# Altium footprint library AHMET_CAN_KARACAN.PcbL.PcbLib: 65 footprints (part 3 of 5)
Each footprint in its own frame and in the unit in brackets; x right, y up, seen from the top. Pads: shape width x height; smd on the part's side, far side on the other; paste and mask are expansions set on the pad; w line width, h text height; cw(c..) or ccw(c..) is an arc to the next point about the centre after c.
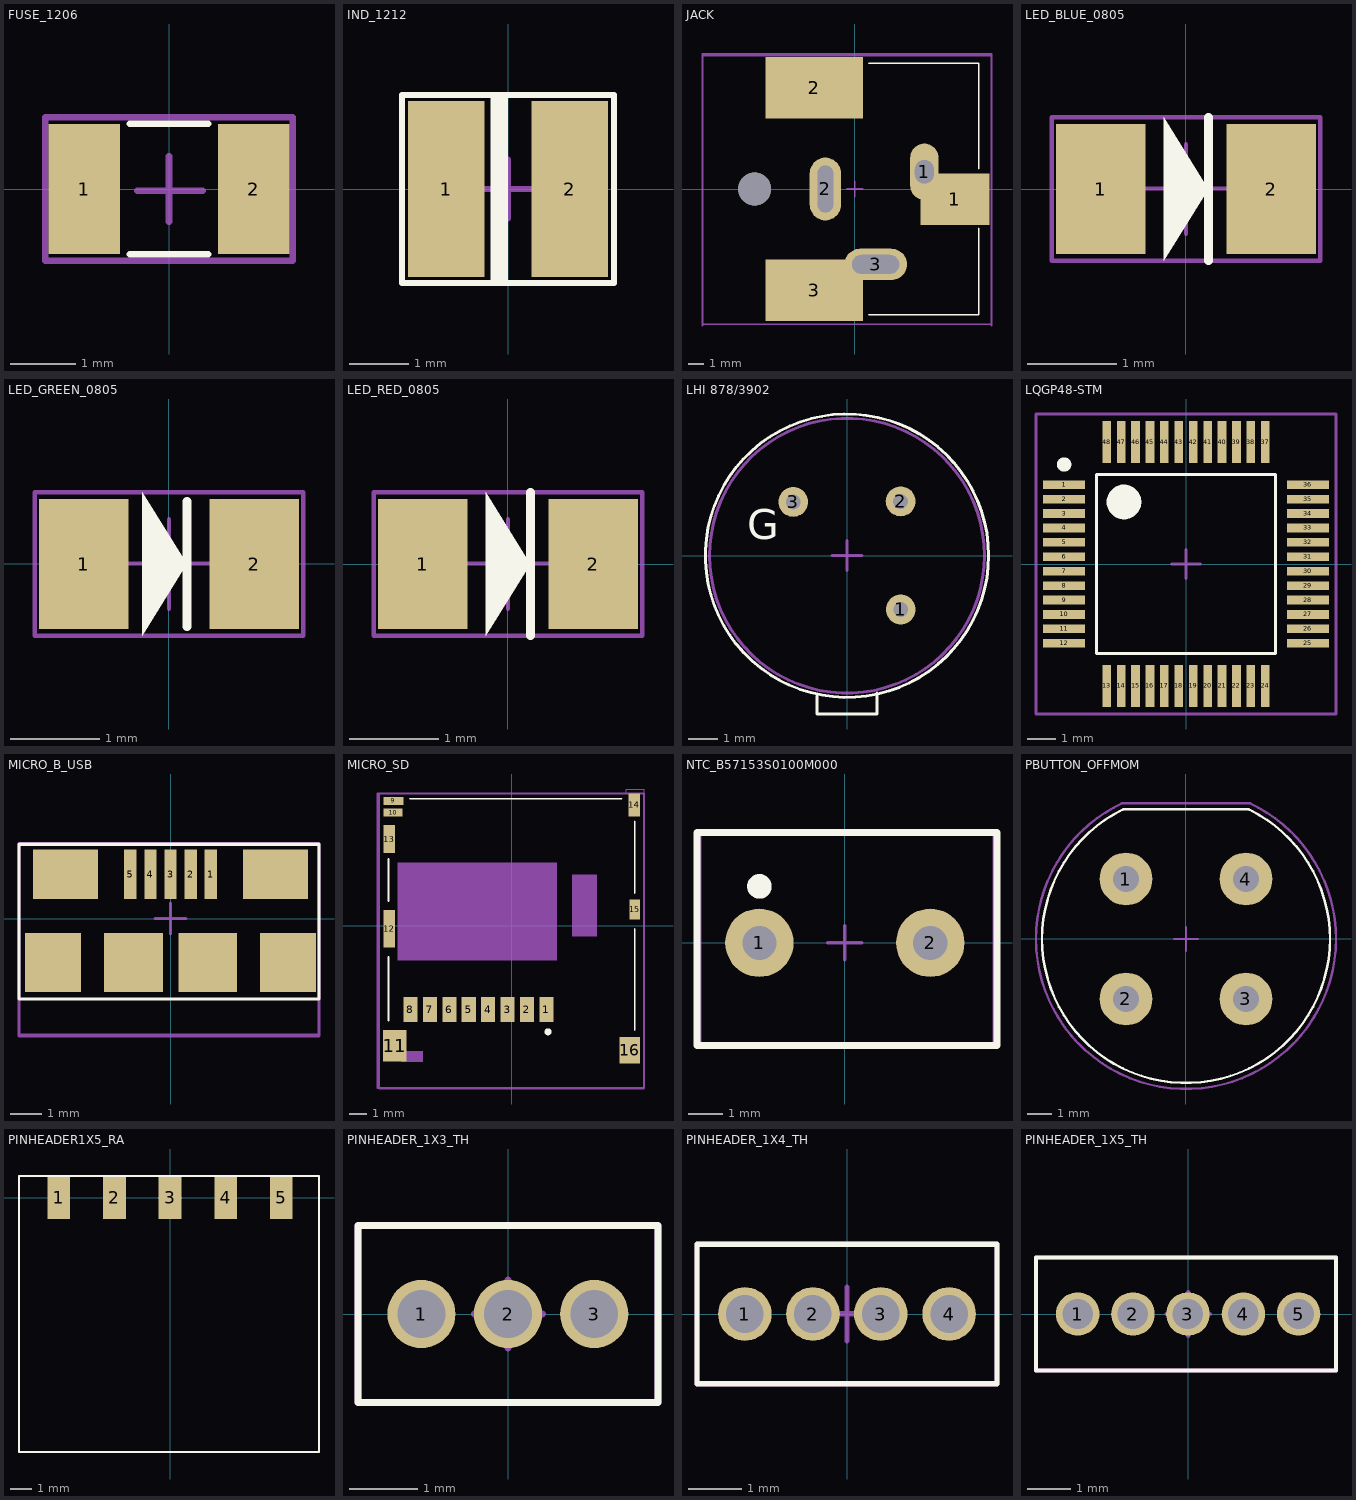
[diagram p2: the footprints below, top view; thin cyan lines are the x and y axes]

## FUSE_1206 [mm]
pads (2):
  rect 1.1x2 smd mask+0.05: 1(-1.3,0) 2(1.3,0)
Top Overlay:
  lines w0.1: -0.6,-1 0.6,-1 ; -0.6,1 0.6,1
Top Component Center:
  lines w0.1: -0.486,-0.024 0.514,-0.024 ; 0,-0.5 0,0.5 ; -1.9,-1.1 1.9,-1.1 1.9,1.1 -1.9,1.1 -1.9,-1.1
Top Designator:
  lines w0.1: -1.9,-1.1 1.9,-1.1 1.9,1.1 -1.9,1.1 -1.9,-1.1
  text ".Designator" at -0.95,-0.317 h1
3D body "FUSE_1206.step": height 0.61, standoff 0, extent -1.55,-0.775 1.55,0.775

## IND_1212 [mm]
pads (2):
  rect 1.3x3 smd mask+0.05: 1(-1.05,0) 2(1.05,0)
Top Overlay:
  rectangle: -0.3,-1.6 0,1.6
  lines w0.1: -1.8,-1.6 1.8,-1.6 1.8,1.6 -1.8,1.6 -1.8,-1.6
Top Component Center:
  lines w0.1: -0.5,0 0.5,0 ; 0,-0.5 0,0.5 ; -1.8,-1.6 1.8,-1.6 1.8,1.6 -1.8,1.6 -1.8,-1.6
Top Designator:
  lines w0.1: -1.8,-1.6 1.8,-1.6 1.8,1.6 -1.8,1.6 -1.8,-1.6
  text ".Designator" at -0.8,-0.35 h0.75
3D body "IND_1212.STEP": height 1.5, standoff 0, extent -1.5,-1.5 1.5,1.5

## JACK [mm]
pads (7):
  oval 1.8x3.6 hole 1.2 slot 1.5 at 90 deg: 1(4.425,1.1)
  rect 4.4x3.3 smd: 1(6.375,-0.65)
  rect 6.2x3.9 smd: 2(-2.575,6.45) 3(-2.575,-6.45)
  oval 2x4 hole 1 slot 3 at 90 deg: 2(-1.875,0)
  oval 4x2 hole 1.2 slot 3 at 0 deg: 3(1.325,-4.8)
  round 2.1 hole 2.1 unplated: ""(-6.375,0)
Top Overlay:
  lines w0.1: 0.9,-8 7.9,-8 7.9,-2.5 ; 7.9,8 0.9,8 7.9,8 ; 7.9,8 7.9,1.3 7.9,8
Top Component Center:
  lines w0.1: -9.7,-8.7 -9.7,8.5 8.7,8.5 8.7,-8.7 ; -9.7,-8.6 8.7,-8.6 ; -0.5,0 0.5,0 ; 0,-0.5 0,0.5
Top Designator:
  lines w0.1: -9.7,-8.7 -9.7,8.6 8.7,8.6 8.7,-8.7 ; -9.7,-8.6 8.7,-8.6
  text ".Designator" at -2.246,-0.738 h1.52
3D body "JACK_PJ-037AH-SMT-TR.stp": height 11.1, standoff -3.3, extent -9.575,-7.625 7.525,7.575

## LED_BLUE_0805 [mm]
pads (2):
  rect 1x1.45 smd mask+0.05: 1(-0.95,0) 2(0.95,0)
Top Overlay:
  region: -0.25,0.8 -0.25,-0.8 0.25,0
  lines w0.1: 0.25,-0.8 0.25,0.8
Top Component Center:
  lines w0.05: -0.487,0.006 0.513,0.006 ; 0,-0.5 0,0.5 ; -1.5,-0.8 1.5,-0.8 1.5,0.8 -1.5,0.8 -1.5,-0.8
Top Designator:
  lines w0.05: -1.5,-0.8 1.5,-0.8 1.5,0.8 -1.5,0.8 -1.5,-0.8
3D body "0805 Blue.step": height 0.78, standoff 0, extent -1,-0.625 1,0.625

## LED_GREEN_0805 [mm]
pads (2):
  rect 1x1.45 smd mask+0.05: 1(-0.95,0) 2(0.95,0)
Top Overlay:
  region: -0.3,0.8 -0.3,-0.8 0.2,0
  lines w0.1: 0.2,0 0.2,-0.7 0.2,0.7
Top Component Center:
  lines w0.05: -0.487,0.006 0.513,0.006 ; 0,-0.5 0,0.5 ; -1.5,-0.8 1.5,-0.8 1.5,0.8 -1.5,0.8 -1.5,-0.8
Top Designator:
  lines w0.05: -1.5,-0.8 1.5,-0.8 1.5,0.8 -1.5,0.8 -1.5,-0.8
3D body "LED-0805-Green.step": height 0.8, standoff -0.01, extent -1.01,-0.625 1.01,0.625

## LED_RED_0805 [mm]
pads (2):
  rect 1x1.45 smd mask+0.05: 1(-0.95,0) 2(0.95,0)
Top Overlay:
  region: -0.25,0.8 -0.25,-0.8 0.25,0
  lines w0.1: 0.25,-0.8 0.25,0.8
Top Component Center:
  lines w0.05: -0.487,0.006 0.513,0.006 ; 0,-0.5 0,0.5 ; -1.5,-0.8 -1.5,0.8 1.5,0.8 1.5,-0.8 -1.5,-0.8
Top Designator:
  lines w0.05: -1.5,-0.8 -1.5,0.8 1.5,0.8 1.5,-0.8 -1.5,-0.8
3D body "LED-0805-Red.step": height 0.8, standoff -0.01, extent -1.01,-0.625 1.01,0.625

## LHI 878/3902 [mm]
pads (3):
  round 1 hole 0.5 mask+0.05: 1(1.8,-1.8) 2(1.796,1.818) 3(-1.8,1.8)
Top Overlay:
  circle w0.1: c0,0 r4.742
  lines w0.1: -1,-4.7 -1,-5.3 1,-5.3 1,-4.6
  text "G" at -3.346,0.554 h1
Top Component Center:
  circle w0.1: c0,0 r4.6
  lines w0.1: -0.5,0 0.5,0 0,0 0,-0.5 0,0.5
Top Designator:
  circle w0.1: c0,0 r4.6
  text ".Designator" at -0.946,-0.438 h1.52
3D body "LHI878.step": height 4.6, standoff -2.4, extent -4.6,-5.029 4.6,4.6

## LQGP48-STM [mm] "TSQFP, 48-Leads, Body 7,00x7,00mm, Pitch 0,50mm, IPC Medium Density"
height 1.6
pads (48):
  rect 1.45x0.3 smd mask+0.055: 1(-4.225,2.75) 2(-4.225,2.25) 3(-4.225,1.75) 4(-4.225,1.25) 5(-4.225,0.75) 6(-4.225,0.25) 7(-4.225,-0.25) 8(-4.225,-0.75) 9(-4.225,-1.25) 10(-4.225,-1.75) 11(-4.225,-2.25) 12(-4.225,-2.75) 25(4.225,-2.75) 26(4.225,-2.25) 27(4.225,-1.75) 28(4.225,-1.25) 29(4.225,-0.75) 30(4.225,-0.25) 31(4.225,0.25) 32(4.225,0.75) 33(4.225,1.25) 34(4.225,1.75) 35(4.225,2.25) 36(4.225,2.75)
  rect 0.3x1.45 smd mask+0.055: 13(-2.75,-4.225) 14(-2.25,-4.225) 15(-1.75,-4.225) 16(-1.25,-4.225) 17(-0.75,-4.225) 18(-0.25,-4.225) 19(0.25,-4.225) 20(0.75,-4.225) 21(1.25,-4.225) 22(1.75,-4.225) 23(2.25,-4.225) 24(2.75,-4.225) 37(2.75,4.225) 38(2.25,4.225) 39(1.75,4.225) 40(1.25,4.225) 41(0.75,4.225) 42(0.25,4.225) 43(-0.25,4.225) 44(-0.75,4.225) 45(-1.25,4.225) 46(-1.75,4.225) 47(-2.25,4.225) 48(-2.75,4.225)
Top Overlay:
  circle w0.6: c-2.15,2.15 r0.3
  circle w0.25: c-4.225,3.45 r0.125
  lines w0.1: -3.1,-3.1 3.1,-3.1 3.1,3.1 -3.1,3.1 -3.1,-3.1
Top Component Center:
  lines w0.1: -0.5,0 0.5,0 ; 0,-0.5 0,0.5 ; -5.2,-5.2 5.2,-5.2 5.2,5.2 -5.2,5.2 -5.2,-5.2
Top Designator:
  lines w0.1: -5.2,-5.2 -5.2,5.2 5.2,5.2 5.2,-5.2 -5.2,-5.2
  text ".Designator" at -2,-0.754 h2.54
3D body "LQGP48-STM-wo_thermal.step": height 1.6, standoff 0, extent -4.5,-4.5 4.5,4.5

## MICRO_B_USB [mm]
pads (11):
  rect 0.4x1.6 smd mask+0.05: 1(1.3,1.425) 2(0.65,1.425) 3(0,1.425) 4(-0.65,1.425) 5(-1.3,1.425)
  rect 1.8x1.9 smd mask+0.05: ""(-3.8,-1.425) ""(3.8,-1.425)
  rect 2.1x1.6 smd mask+0.05: ""(-3.4,1.425) ""(3.4,1.425)
  rect 1.9x1.9 smd mask+0.05: ""(-1.2,-1.425) ""(1.2,-1.425)
Top Overlay:
  lines w0.1: -4.9,-2.6 -4.9,2.4 4.8,2.4 4.8,-2.6 -4.9,-2.6
Top Component Center:
  lines w0.1: -4.7,-3.775 -4.9,-3.775 ; -0.5,0 0.5,0 ; 0,-0.5 0,0.5 ; -4.9,-3.775 -4.9,2.425 4.8,2.425 4.8,-3.775 -4.9,-3.775
Top Designator:
  lines w0.1: -4.9,-3.8 -4.9,2.4 4.8,2.4 4.8,-3.8 -4.9,-3.8
  text ".Designator" at -1.346,-0.738 h1.52
3D body "MICRO_B_USB.STEP": height 2.51, standoff -0.28, extent -3.955,-3.575 3.955,2.091

## MICRO_SD [mm]
pads (16):
  rect 0.8x1.4 smd: 1(1.965,-4.75) 2(0.865,-4.75) 3(-0.235,-4.75) 4(-1.335,-4.75) 5(-2.435,-4.75) 6(-3.535,-4.75) 7(-4.635,-4.75) 8(-5.735,-4.75)
  rect 1.15x0.45 smd: 9(-6.7,7.075)
  rect 1.1x0.45 smd: 10(-6.725,6.415)
  rect 1.35x1.8 smd: 11(-6.625,-6.8)
  rect 0.65x2.14 smd: 12(-6.95,-0.17)
  rect 0.65x1.6 smd: 13(-6.95,4.91)
  rect 0.65x1.3 smd: 14(6.95,6.85)
  rect 0.6x1.15 smd: 15(6.975,0.925)
  rect 1.16x1.5 smd: 16(6.695,-7.05)
Top Overlay:
  circle w0.2: c2.06,-6.01 r0.1
  lines w0.1: -6.975,-5.38 -6.975,-1.77 ; -6.975,1.41 -6.975,3.8 ; -5.77,7.2 6.24,7.2 ; 6.975,-5.9 6.975,-0.17 ; 6.975,1.85 6.975,5.91
Top Component Center:
  lines w0.1: -0.5,0 0.5,0 ; 0,-0.5 0,0.5 ; -7.5,-9.2 7.5,-9.2 7.5,7.5 -7.5,7.5 -7.5,-9.2
Top Designator:
  lines w0.1: -7.6,-9.2 7.5,-9.2 7.5,7.5 -7.6,7.5 -7.6,-9.2
  text ".Designator" at -2.65,-1.004 h2.54
Mechanical 15:
  region: 4.825,-0.6 3.426,-0.6 3.426,2.9 4.825,2.9
  region: 2.565,-1.964 -6.447,-1.964 -6.447,3.57 2.565,3.57
  region: -5.045,-7.713 -6.236,-7.713 -6.236,-7.1 -5.045,-7.1
  lines w0.05: -7.5,-9.25 7.5,-9.25 7.5,7.75 6.5,7.75 6.5,7.5 -7.5,7.5 -7.5,-9.25
3D body "MICRO_SD.stp": height 1.8, standoff 0, extent -7.03,-8.9 7,7.3

## NTC_B57153S0100M000 [mm]
pads (2):
  round 2 hole 1: 1(-2.5,0) 2(2.5,0)
Top Overlay:
  circle w0.4: c-2.5,1.65 r0.16
  lines w0.2: -4.325,-3 4.45,-3 4.45,3.225 -4.325,3.225 -4.325,-3
Top Component Center:
  lines w0.1: -0.5,0 0.5,0 ; 0,-0.5 0,0.5 ; -4.25,-3 -4.25,3.225 4.375,3.225 4.375,-3 -4.25,-3
Top Designator:
  lines w0.1: -4.275,-2.975 -4.275,3.2 4.425,3.2 4.425,-2.975 -4.275,-2.975
  text ".Designator" at -0.675,-0.358 h0.8
3D body "NTC F5 D8.5 B6 H13.step": height 13, standoff -3.6, extent -4.18,-3.075 4.311,3.125

## PBUTTON_OFFMOM [mm]
pads (4):
  round 2.2 hole 1.1: 1(-2.5,2.5) 2(-2.5,-2.5) 3(2.5,-2.5) 4(2.5,2.5)
Top Overlay:
  lines w0.1: -2.63,5.393 ccw(c0.001,-0.001) -6,-0.001 ccw(c0,0) 6,0 ; -2.615,5.4 2.615,5.4 ; 2.628,5.393 cw(c-0.003,-0.002) 6,-0.002
Top Component Center:
  lines w0.1: -2.672,5.65 2.672,5.65 ; -2.641,5.664 ccw(c0,0) -6.25,0 ccw(c0,0) 6.25,0 ; 0,-0.5 0,0.5 0,-0.5 ; 2.642,5.664 cw(c0.002,0.001) 6.25,0.001 ; -0.5,0 0.5,0 -0.5,0
Top Designator:
  lines w0.1: -2.672,5.65 2.672,5.65 ; -2.641,5.665 ccw(c0,0) -6.25,0 ccw(c0,0) 6.25,0 ; 2.642,5.664 cw(c0.002,0.001) 6.25,0.001
  text ".Designator" at -1.25,-0.417 h1
3D body "PBUTTON_OFFMOM.STEP": height 14.3, standoff -3.5, extent -6,-6 6,5.4

## PINHEADER1X5_RA [mm]
pads (5):
  rect 1.04x1.91 smd mask+0: 1(-5.08,0) 2(-2.54,0) 3(0,0) 4(2.54,0) 5(5.08,0)
Top Overlay:
  lines w0.1: -6.9,-11.6 -6.9,1 6.8,1 6.8,-11.6 -6.9,-11.6
Top Component Center:
  lines w0.1: -6.85,1 6.8,1 6.8,-11.6 -6.9,-11.6 -6.9,1 -6.8,1 ; -0.5,0 0.5,0 ; 0,-0.5 0,0.5
Top Designator:
  lines w0.1: -6.9,-11.6 6.8,-11.6 6.8,1 -6.9,1 -6.9,-11.6
  text ".Designator" at -2.046,-5.738 h1.52
3D body "SMH-105-02-L-S.stp": height 2.21, standoff -0.21, extent -6.604,-11.4 6.604,0.538

## PINHEADER_1X3_TH [mm]
pads (3):
  round 1 hole 0.7 mask+0.05: 1(-1.27,0) 2(0,0) 3(1.265,0)
Top Overlay:
  lines w0.1: -2.2,-1.3 -2.2,1.3 2.2,1.3 2.2,-1.3 -2.2,-1.3
Top Component Center:
  lines w0.1: -0.496,0 0.504,0 ; 0,-0.5 0,0.5 ; -2.2,-1.3 -2.2,1.3 2.2,1.3 2.2,-1.3 -2.2,-1.3
Top Designator:
  lines w0.1: -2.2,-1.3 -2.2,1.3 2.2,1.3 2.2,-1.3 -2.2,-1.3
  text ".Designator" at -0.95,-0.417 h1
3D body "PINHEADER_1X3_TH.STEP": height 4.6, standoff -3, extent -2.108,-1.245 2.108,1.245

## PINHEADER_1X4_TH [mm]
pads (4):
  round 1 hole 0.7 mask+0.05: 1(-1.905,0) 2(-0.635,0) 3(0.63,0) 4(1.905,0)
Top Overlay:
  lines w0.1: -2.8,-1.3 2.8,-1.3 2.8,1.3 -2.8,1.3 -2.8,-1.3
Top Component Center:
  lines w0.1: -0.505,0.004 0.495,0.004 ; 0,-0.5 0,0.5 ; -2.8,-1.3 -2.8,1.3 2.8,1.3 2.8,-1.3 -2.8,-1.3
Top Designator:
  lines w0.1: -2.8,-1.3 -2.8,1.3 2.8,1.3 2.8,-1.3 -2.8,-1.3
  text ".Designator" at -1.35,-0.55 h1.2
3D body "PINHEADER_1X4_TH.STEP": height 4.6, standoff -3, extent -2.743,-1.245 2.743,1.245

## PINHEADER_1X5_TH [mm]
pads (5):
  round 1 hole 0.7 mask+0.05: 1(-2.54,0) 2(-1.27,0) 3(-0.005,0) 4(1.27,0) 5(2.54,0)
Top Overlay:
  lines w0.1: -3.5,-1.3 -3.5,1.3 3.4,1.3 3.4,-1.3 -3.5,-1.3
Top Component Center:
  lines w0.1: -0.5,0 0.5,0 ; 0,-0.5 0,0.5 ; -3.5,-1.3 -3.5,1.3 3.4,1.3 3.4,-1.3 -3.5,-1.3
Top Designator:
  lines w0.1: -3.5,-1.3 -3.5,1.3 3.4,1.3 3.4,-1.3 -3.5,-1.3
  text ".Designator" at -1.45,-0.55 h1.2
3D body "PINHEADER_1X5_TH.STEP": height 4.6, standoff -3, extent -3.383,-1.245 3.373,1.245